# Altium footprint library MOLEX SMD.PcbLib: 54 footprints (part 3 of 4)
Each footprint in its own frame and in the unit in brackets; x right, y up, seen from the top. Pads: shape width x height; smd on the part's side, far side on the other; paste and mask are expansions set on the pad; w line width, h text height; cw(c..) or ccw(c..) is an arc to the next point about the centre after c.
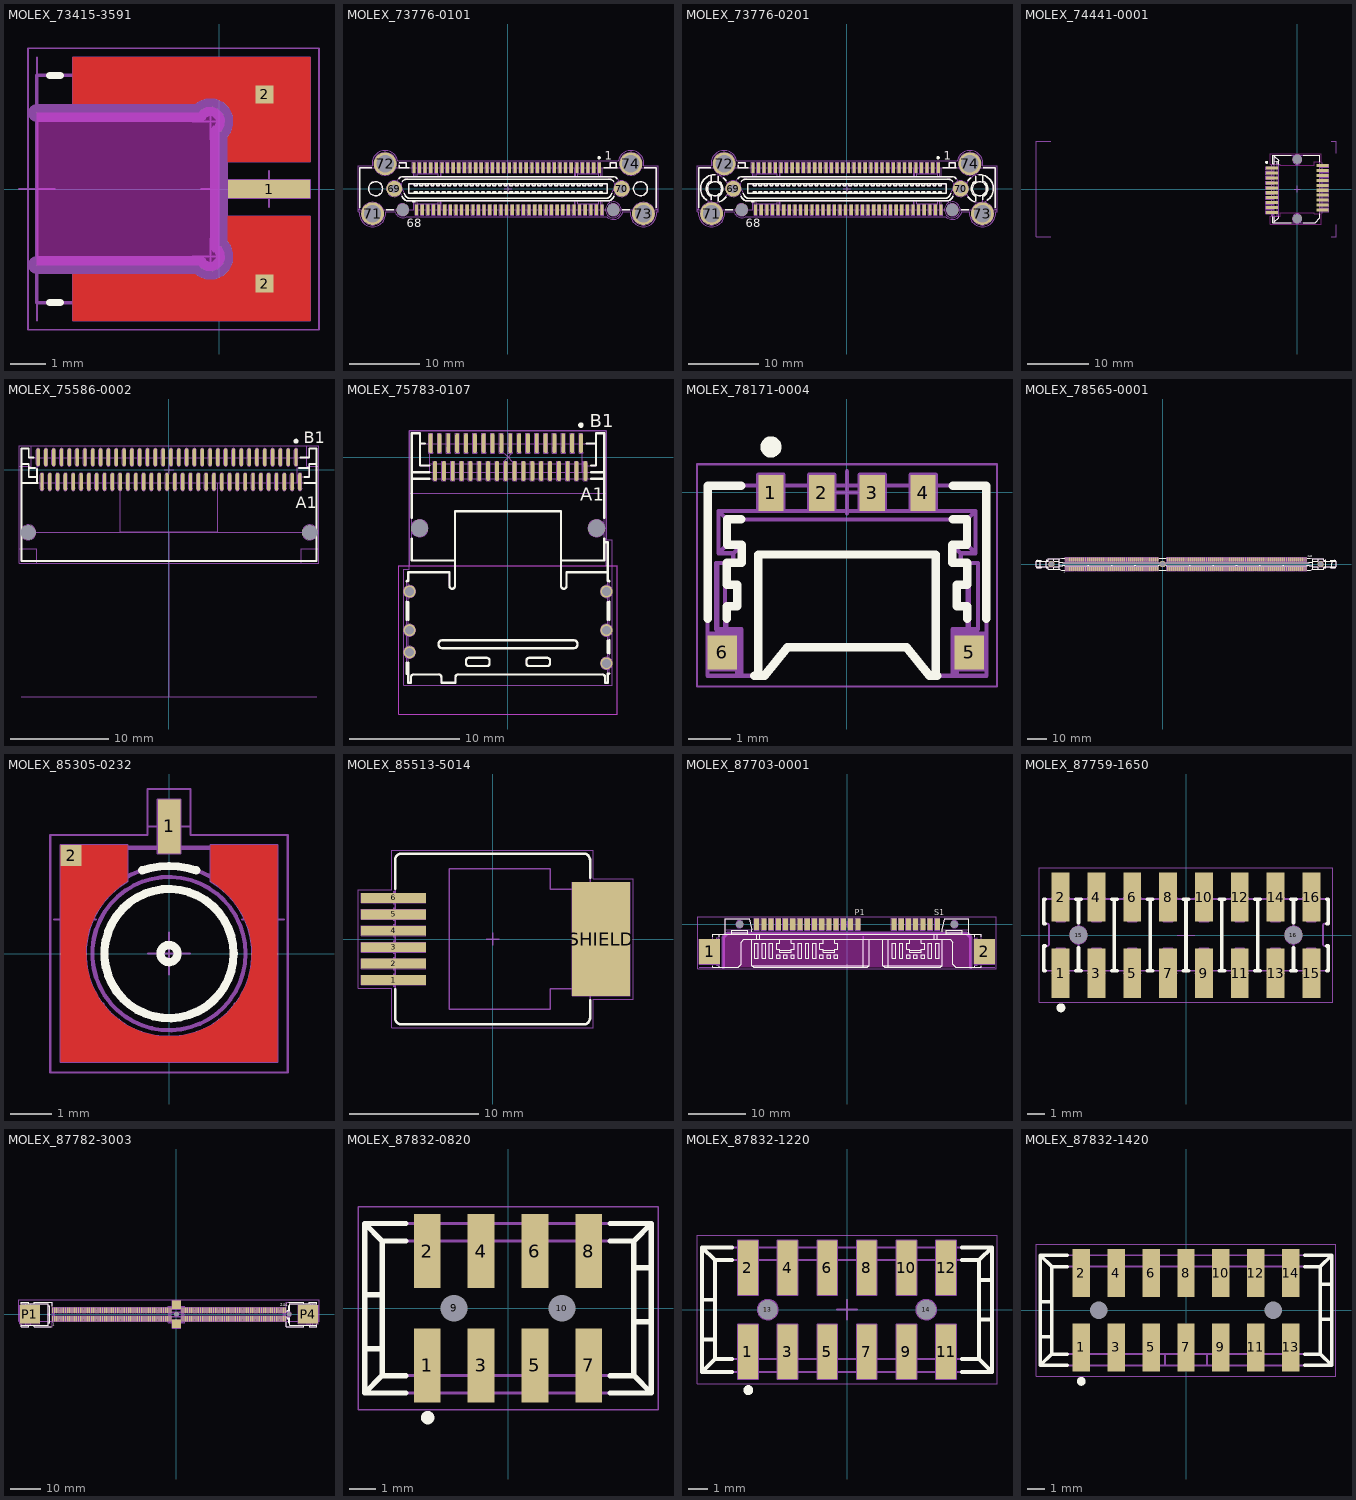
[diagram p2: the footprints below, top view; thin cyan lines are the x and y axes]

## MOLEX_73415-3591 [mm] "50 Ohms, SMP Edge Mount PCB Plug, Leg Length 1.27mm"
height 4.34
pads (3):
  rect 2.29x0.51 smd: 1(1.395,0)
  rect 0.5x0.5 smd paste-0.25 mask-0.25: 2(1.27,-2.637) 2(1.27,2.637)
Top Layer:
  region: -4.08,-3.675 -4.08,-2.375 -0.667,-2.375 -0.568,-2.446 -0.339,-2.527 -0.097,-2.519 0.126,-2.422 0.297,-2.251 0.394,-2.028 0.402,-1.786 0.321,-1.557 0.25,-1.458 0.25,-0.76 2.54,-0.76 2.54,-3.675
  region: -4.08,2.375 -4.08,3.675 2.54,3.675 2.54,0.76 0.25,0.76 0.25,1.458 0.321,1.557 0.402,1.786 0.394,2.028 0.297,2.251 0.126,2.422 -0.097,2.519 -0.339,2.527 -0.568,2.446 -0.667,2.375
Top Overlay:
  lines w0.2: -4.73,-3.169 -4.43,-3.169 ; -4.73,3.169 -4.43,3.169
Keep-Out Layer:
  board cut-out: -5.08,-2.125 -5.08,2.125 -0.56,2.125 -0.508,2.195 -0.355,2.278 -0.182,2.29 -0.019,2.229 0.104,2.106 0.165,1.943 0.153,1.77 0.069,1.617 0,1.565 0,-1.565 0.069,-1.617 0.153,-1.77 0.165,-1.943 0.104,-2.106 -0.019,-2.229 -0.182,-2.29 -0.355,-2.278 -0.508,-2.195 -0.56,-2.125
Mechanical 1:
  lines w0.5: -5.08,-2.125 -0.56,-2.125 ccw(c-0.24,-1.885) 0,-1.565 0,1.565 ccw(c-0.24,1.885) -0.56,2.125 -5.08,2.125
Mechanical 8:
  lines w0.05: -5.58,0 -5.08,0 ; -5.08,-3.675 -5.08,-2.375 ; -5.08,-0.5 -5.08,0 ; -5.08,0.5 -5.08,0 ; -5.08,2.375 -5.08,3.675 ; -4.58,0 -5.08,0 ; -0.74,-1.885 -0.24,-1.885 ; -0.74,1.885 -0.24,1.885 ; -0.5,0 0,0 ; -0.24,-2.385 -0.24,-1.885 ; -0.24,-1.385 -0.24,-1.885 ; -0.24,1.385 -0.24,1.885 ; -0.24,2.385 -0.24,1.885 ; 0,-0.5 0,0 ; 0,0.5 0,0 ; 0.26,-1.885 -0.24,-1.885 ; 0.26,1.885 -0.24,1.885 ; 0.5,0 0,0 ; 0.77,-2.637 1.27,-2.637 ; 0.77,2.637 1.27,2.637 ; 0.895,0 1.395,0 ; 1.27,-3.137 1.27,-2.637 ; 1.27,-2.137 1.27,-2.637 ; 1.27,2.137 1.27,2.637 ; 1.27,3.137 1.27,2.637 ; 1.395,-0.5 1.395,0 ; 1.395,0.5 1.395,0 ; 1.77,-2.637 1.27,-2.637 ; 1.77,2.637 1.27,2.637 ; 1.895,0 1.395,0 ; -4.08,-3.675 2.54,-3.675 2.54,-0.76 0.25,-0.76 0.25,-1.458 cw(c-0.24,-1.885) -0.667,-2.375 -4.08,-2.375 -4.08,-3.675 ; -4.08,2.375 -4.08,3.675 2.54,3.675 2.54,0.76 0.25,0.76 0.25,1.458 ccw(c-0.24,1.885) -0.667,2.375 -4.08,2.375 ; 0.25,-0.255 0.25,0.255 2.54,0.255 2.54,-0.255 0.25,-0.255
  text "PCB Edge" at -5.715,-2.54 h0.75
Mechanical 14:
  lines w0.1: -5.08,-2.22 0,-2.22 ; -5.08,2.22 0,2.22 ; 0,-2.105 1.27,-2.105 1.27,-3.169 0,-3.169 ; 0,-0.19 1.194,-0.19 1.27,-0.114 1.27,0.114 1.194,0.19 0,0.19 ; 0,2.105 1.27,2.105 1.27,3.169 0,3.169 ; 0,-3.169 0,3.169 ; 0,-3.169 -5.08,-3.169 -5.08,3.169 0,3.169
Mechanical 15:
  lines w0.05: -5.33,-3.925 -5.33,3.925 2.79,3.925 2.79,-3.925 -5.33,-3.925
Drill Drawing:
  text "5.08" at -3.175,-1.587 h0.75
  text "r0.4" at -2.381,0.794 h0.75
  text "4.25" at -3.969,-1.111 h0.75
3D body "MOLEX_73415-3591.stp": height 2.46, standoff -1.88, extent -5.08,-3.169 1.27,3.169

## MOLEX_73776-0101 [mm] "0.80mm Pitch, 68 Contacts, Ultra+ VHDCI Surface Mount Vertical Receptacle Without Screwlock Kit"
height 10.7
pads (76):
  rect 0.45x1.5 smd: 1(13,3) 2(12.2,3) 3(11.4,3) 4(10.6,3) 5(9.8,3) 6(9,3) 7(8.2,3) 8(7.4,3) 9(6.6,3) 10(5.8,3) 11(5,3) 12(4.2,3) 13(3.4,3) 14(2.6,3) 15(1.8,3) 16(1,3) 17(0.2,3) 18(-0.6,3) 19(-1.4,3) 20(-2.2,3) 21(-3,3) 22(-3.8,3) 23(-4.6,3) 24(-5.4,3) 25(-6.2,3) 26(-7,3) 27(-7.8,3) 28(-8.6,3) 29(-9.4,3) 30(-10.2,3) 31(-11,3) 32(-11.8,3) 33(-12.6,3) 34(-13.4,3) 35(13.4,-3) 36(12.6,-3) 37(11.8,-3) 38(11,-3) 39(10.2,-3) 40(9.4,-3) 41(8.6,-3) 42(7.8,-3) 43(7,-3) 44(6.2,-3) 45(5.4,-3) 46(4.6,-3) 47(3.8,-3) 48(3,-3) 49(2.2,-3) 50(1.4,-3) 51(0.6,-3) 52(-0.2,-3) 53(-1,-3) 54(-1.8,-3) 55(-2.6,-3) 56(-3.4,-3) 57(-4.2,-3) 58(-5,-3) 59(-5.8,-3) 60(-6.6,-3) 61(-7.4,-3) 62(-8.2,-3) 63(-9,-3) 64(-9.8,-3) 65(-10.6,-3) 66(-11.4,-3) 67(-12.2,-3) 68(-13,-3)
  round 2.25 hole 1.2: 69(-16.175,0) 70(16.175,0)
  round 3.24 hole 2.45: 71(-19.275,-3.55) 72(-17.485,3.55) 73(19.275,-3.55) 74(17.485,3.55)
  round 0.5 hole 1.75 unplated mask+0.625: 75(-14.995,-3) 75(14.995,-3)
Top Overlay:
  drawing of 242 lines, arcs and shapes, not listed
  text "1" at 13.8,4.1 h1.2
  text "68" at -14.4,-5.5 h1.2
Mechanical 8:
  drawing of 527 lines, arcs and shapes, not listed
Mechanical 14:
  drawing of 506 lines, arcs and shapes, not listed
  text "1" at 13.8,4.1 h1.2
  text "68" at -14.4,-5.5 h1.2
Mechanical 15:
  lines w0.05: -17.429,-3.25 cw(c-19.275,-3.55) -21.121,-3.25 -21.35,-3.25 -21.35,3.25 -19.331,3.25 cw(c-17.485,3.55) -15.67,4 15.67,4 cw(c17.485,3.55) 19.331,3.25 21.35,3.25 21.35,-3.25 21.121,-3.25 cw(c19.275,-3.55) 17.429,-3.25 16.347,-3.25 cw(c14.995,-3) 14.051,-4 -14.48,-4 cw(c-14.995,-3) -16.092,-3.25 ; -17.429,-3.25 -16.092,-3.25 ; -17.429,-3.25 -16.092,-3.25
3D body "MOLEX_73776-0101.stp": height 10.7, standoff -6.2, extent -21.25,-3.73 21.25,3.73

## MOLEX_73776-0201 [mm] "0.80mm Pitch, 68 Contacts, Ultra+ VHDCI Surface Mount Vertical Receptacle With Screwlock Kit"
height 10.7
pads (76):
  rect 0.45x1.5 smd: 1(13,3) 2(12.2,3) 3(11.4,3) 4(10.6,3) 5(9.8,3) 6(9,3) 7(8.2,3) 8(7.4,3) 9(6.6,3) 10(5.8,3) 11(5,3) 12(4.2,3) 13(3.4,3) 14(2.6,3) 15(1.8,3) 16(1,3) 17(0.2,3) 18(-0.6,3) 19(-1.4,3) 20(-2.2,3) 21(-3,3) 22(-3.8,3) 23(-4.6,3) 24(-5.4,3) 25(-6.2,3) 26(-7,3) 27(-7.8,3) 28(-8.6,3) 29(-9.4,3) 30(-10.2,3) 31(-11,3) 32(-11.8,3) 33(-12.6,3) 34(-13.4,3) 35(13.4,-3) 36(12.6,-3) 37(11.8,-3) 38(11,-3) 39(10.2,-3) 40(9.4,-3) 41(8.6,-3) 42(7.8,-3) 43(7,-3) 44(6.2,-3) 45(5.4,-3) 46(4.6,-3) 47(3.8,-3) 48(3,-3) 49(2.2,-3) 50(1.4,-3) 51(0.6,-3) 52(-0.2,-3) 53(-1,-3) 54(-1.8,-3) 55(-2.6,-3) 56(-3.4,-3) 57(-4.2,-3) 58(-5,-3) 59(-5.8,-3) 60(-6.6,-3) 61(-7.4,-3) 62(-8.2,-3) 63(-9,-3) 64(-9.8,-3) 65(-10.6,-3) 66(-11.4,-3) 67(-12.2,-3) 68(-13,-3)
  round 2.25 hole 1.2: 69(-16.175,0) 70(16.175,0)
  round 3.24 hole 2.45: 71(-19.275,-3.55) 72(-17.485,3.55) 73(19.275,-3.55) 74(17.485,3.55)
  round 0.5 hole 1.75 unplated mask+0.625: 75(-14.995,-3) 75(14.995,-3)
Top Overlay:
  drawing of 260 lines, arcs and shapes, not listed
  text "68" at -14.4,-5.5 h1.2
  text "1" at 13.8,4.1 h1.2
Mechanical 8:
  drawing of 527 lines, arcs and shapes, not listed
Mechanical 14:
  drawing of 520 lines, arcs and shapes, not listed
  text "68" at -14.4,-5.5 h1.2
  text "1" at 13.8,4.1 h1.2
Mechanical 15:
  lines w0.05: -17.429,-3.25 cw(c-19.275,-3.55) -21.121,-3.25 -21.35,-3.25 -21.35,3.25 -19.331,3.25 cw(c-17.485,3.55) -15.67,4 15.67,4 cw(c17.485,3.55) 19.331,3.25 21.35,3.25 21.35,-3.25 21.121,-3.25 cw(c19.275,-3.55) 17.429,-3.25 16.347,-3.25 cw(c14.995,-3) 14.051,-4 -14.48,-4 cw(c-14.995,-3) -16.092,-3.25 ; -17.429,-3.25 -16.092,-3.25 ; -17.429,-3.25 -16.092,-3.25
3D body "MOLEX_73776-0201.stp": height 10.7, standoff -6.2, extent -21.25,-3.73 21.25,3.73

## MOLEX_74441-0001 [mm] "20 Position, Pitch 0.8mm SFP+ Receptacle (Small Form-factor Pluggable)"
height 5.4
pads (22):
  rect 2x0.5 smd: 1(-4.1,3.395) 2(-4.1,2.595) 3(-4.1,1.795) 4(-4.1,0.995) 5(-4.1,0.195) 6(-4.1,-0.605) 7(-4.1,-1.405) 8(-4.1,-2.205) 9(-4.1,-3.005) 10(-4.1,-3.805) 11(4.1,-3.405) 12(4.1,-2.605) 13(4.1,-1.805) 14(4.1,-1.005) 15(4.1,-0.205) 16(4.1,0.595) 17(4.1,1.395) 18(4.1,2.195) 19(4.1,2.995) 20(4.1,3.795)
  round 0.5 hole 1.55 unplated mask+0.525: MTG1(0,4.795) MTG2(0,-4.805)
Top Layer keep-out:
  lines w0.1: -4.34,-5.755 3.94,-5.755 3.94,-4.805 3.94,-3.995 2.78,-3.995 2.78,-3.855 -2.78,-3.855 -2.78,-4.395 -4.34,-4.395 -4.34,-5.755 ; -4.34,3.985 -2.78,3.985 -2.78,3.845 2.78,3.845 2.78,4.385 3.94,4.385 3.94,5.745 -4.34,5.745 -4.34,3.985
Top Overlay:
  circle w0.25: c-4.955,4.318 r0.125
  lines w0.2: -4,-4.505 -4,-5.505 -0.944,-5.505 ; -3.7,-5.505 -3.7,-4.505 ; -3.7,-5.305 -2.98,-4.705 -2.98,-4.505 ; -3.7,4.045 -3.7,5.495 ; -3.7,4.095 -4,4.095 -4,5.495 -0.944,5.495 ; -3.7,4.432 -2.98,4.495 ; -3.7,5.295 -2.98,4.695 -2.98,4.045 ; -3.223,4.045 -3.223,4.474 ; 0.944,-5.505 2.9,-5.505 3.7,-4.705 3.7,-4.055 ; 0.944,5.495 3.7,5.495 3.7,4.445
Mechanical 8:
  circle w0.1: c0,4.795 r0.775
  circle w0.1: c0,-4.805 r0.775
  lines w0.1: -40,-7.774 -42.4,-7.774 -42.4,7.774 -40,7.774 ; -4.6,-3.805 -4.1,-3.805 -3.6,-3.805 ; -4.6,-3.005 -4.1,-3.005 -3.6,-3.005 ; -4.6,-2.205 -4.1,-2.205 -3.6,-2.205 ; -4.6,-1.405 -4.1,-1.405 -3.6,-1.405 ; -4.6,-0.605 -4.1,-0.605 -3.6,-0.605 ; -4.6,0.195 -4.1,0.195 -3.6,0.195 ; -4.6,0.995 -4.1,0.995 -3.6,0.995 ; -4.6,1.795 -4.1,1.795 -3.6,1.795 ; -4.6,2.595 -4.1,2.595 -3.6,2.595 ; -4.6,3.395 -4.1,3.395 -3.6,3.395 ; -4.1,-4.305 -4.1,3.895 ; -0.5,-4.805 0,-4.805 ; -0.5,0 0,0 ; -0.5,4.795 0,4.795 ; 0,-5.305 0,-4.805 ; 0,-4.305 0,-4.805 ; 0,-0.5 0,0 ; 0,0.5 0,0 ; 0,4.295 0,4.795 ; 0,5.295 0,4.795 ; 0.5,-4.805 0,-4.805 ; 0.5,0 0,0 ; 0.5,4.795 0,4.795 ; 3.6,-3.405 4.1,-3.405 4.6,-3.405 ; 3.6,-2.605 4.1,-2.605 4.6,-2.605 ; 3.6,-1.805 4.1,-1.805 4.6,-1.805 ; 3.6,-1.005 4.1,-1.005 4.6,-1.005 ; 3.6,-0.205 4.1,-0.205 4.6,-0.205 ; 3.6,0.595 4.1,0.595 4.6,0.595 ; 3.6,1.395 4.1,1.395 4.6,1.395 ; 3.6,2.195 4.1,2.195 4.6,2.195 ; 3.6,2.995 4.1,2.995 4.6,2.995 ; 3.6,3.795 4.1,3.795 4.6,3.795 ; 4.1,-3.905 4.1,4.295 ; 5.5,-7.774 6.3,-7.774 6.3,-5.777 ; 5.5,7.774 6.3,7.774 6.3,5.777
Mechanical 14:
  circle w0.1: c-4.955,4.318 r0.125
  lines w0.1: -3.7,-5.505 -3.7,-4.105 ; -3.7,-5.305 -2.98,-4.705 -2.98,-4.505 ; -3.7,-4.442 -2.98,-4.505 ; -3.7,-4.055 -5.1,-4.055 -5.1,-3.555 -3.7,-3.555 ; -3.7,-3.255 -5.1,-3.255 -5.1,-2.755 -3.7,-2.755 ; -3.7,-2.455 -5.1,-2.455 -5.1,-1.955 -3.7,-1.955 ; -3.7,-1.655 -5.1,-1.655 -5.1,-1.155 -3.7,-1.155 ; -3.7,-0.855 -5.1,-0.855 -5.1,-0.355 -3.7,-0.355 ; -3.7,-0.055 -5.1,-0.055 -5.1,0.445 -3.7,0.445 ; -3.7,0.745 -5.1,0.745 -5.1,1.245 -3.7,1.245 ; -3.7,1.545 -5.1,1.545 -5.1,2.045 -3.7,2.045 ; -3.7,2.345 -5.1,2.345 -5.1,2.845 -3.7,2.845 ; -3.7,3.145 -5.1,3.145 -5.1,3.645 -3.7,3.645 ; -3.7,4.432 -2.98,4.495 ; -3.7,5.295 -2.985,4.695 -2.98,4.695 -2.98,4.495 ; -3.7,5.495 -3.7,4.095 ; -3.223,-4.484 -3.223,4.474 ; 3.7,-3.655 5.1,-3.655 5.1,-3.155 3.7,-3.155 ; 3.7,-2.855 5.1,-2.855 5.1,-2.355 3.7,-2.355 ; 3.7,-2.055 5.1,-2.055 5.1,-1.555 3.7,-1.555 ; 3.7,-1.255 5.1,-1.255 5.1,-0.755 3.7,-0.755 ; 3.7,-0.455 5.1,-0.455 5.1,0.045 3.7,0.045 ; 3.7,0.345 5.1,0.345 5.1,0.845 3.7,0.845 ; 3.7,1.145 5.1,1.145 5.1,1.645 3.7,1.645 ; 3.7,1.945 5.1,1.945 5.1,2.445 3.7,2.445 ; 3.7,2.745 5.1,2.745 5.1,3.245 3.7,3.245 ; 3.7,3.545 5.1,3.545 5.1,4.045 3.7,4.045 ; -3.7,-4.105 -4,-4.105 -4,-5.505 2.9,-5.505 3.7,-4.705 3.7,5.495 -4,5.495 -4,4.095 -3.7,4.095 ; -3.7,-4.105 -3.7,4.095 ; -2.98,-4.505 -2.98,4.495
3D body "MOLEX_74441-0001.stp": height 5.37, standoff -0.9, extent -4.54,-5.5 4.61,5.5

## MOLEX_75586-0002 [mm] "68 Circuits, Pitch 0.8mm, External Application Right Angle iPass™ I/O Surface Mount Receptacle"
height 5.43
pads (70):
  oval 0.35x1.8 smd: A1(13.4,-1.255) A2(12.6,-1.255) A3(11.8,-1.255) A4(11,-1.255) A5(10.2,-1.255) A6(9.4,-1.255) A7(8.6,-1.255) A8(7.8,-1.255) A9(7,-1.255) A10(6.2,-1.255) A11(5.4,-1.255) A12(4.6,-1.255) A13(3.8,-1.255) A14(3,-1.255) A15(2.2,-1.255) A16(1.4,-1.255) A17(0.6,-1.255) A18(-0.2,-1.255) A19(-1,-1.255) A20(-1.8,-1.255) A21(-2.6,-1.255) A22(-3.4,-1.255) A23(-4.2,-1.255) A24(-5,-1.255) A25(-5.8,-1.255) A26(-6.6,-1.255) A27(-7.4,-1.255) A28(-8.2,-1.255) A29(-9,-1.255) A30(-9.8,-1.255) A31(-10.6,-1.255) A32(-11.4,-1.255) A33(-12.2,-1.255) A34(-13,-1.255) B1(13,1.255) B2(12.2,1.255) B3(11.4,1.255) B4(10.6,1.255) B5(9.8,1.255) B6(9,1.255) B7(8.2,1.255) B8(7.4,1.255) B9(6.6,1.255) B10(5.8,1.255) B11(5,1.255) B12(4.2,1.255) B13(3.4,1.255) B14(2.6,1.255) B15(1.8,1.255) B16(1,1.255) B17(0.2,1.255) B18(-0.6,1.255) B19(-1.4,1.255) B20(-2.2,1.255) B21(-3,1.255) B22(-3.8,1.255) B23(-4.6,1.255) B24(-5.4,1.255) B25(-6.2,1.255) B26(-7,1.255) B27(-7.8,1.255) B28(-8.6,1.255) B29(-9.4,1.255) B30(-10.2,1.255) B31(-11,1.255) B32(-11.8,1.255) B33(-12.6,1.255) B34(-13.4,1.255)
  round 0.5 hole 1.55 unplated mask+0.525: MTG1(-14.4,-6.435) MTG2(14.4,-6.435)
Top Overlay:
  circle w0.25: c13,2.9 r0.125
  lines w0.2: -15.1,-1.367 -13.475,-1.367 ; -15.1,0.568 -14.35,0.568 -14.35,-0.759 -13.5,-0.759 ; -14.35,0.168 -13.708,0.168 ; -13.875,1.221 -14.35,1.221 -14.35,2.166 -15.1,2.166 -15.1,-9.338 15.1,-9.338 15.1,2.166 14.35,2.166 14.35,1.221 13.475,1.221 ; -13.5,-1.367 -13.5,0.066 ; 13.308,0.168 14.35,0.168 ; 13.875,-1.367 15.1,-1.367 ; 13.875,-0.759 14.35,-0.759 14.35,0.568 15.1,0.568
  text "A1" at 12.95,-3.95 h1.2
  text "B1" at 13.8,2.7 h1.2
Mechanical 8:
  drawing of 443 lines, arcs and shapes, not listed
  text "PCB Edge" at -4.675,-22.7 h1.2
Mechanical 14:
  lines w0.1: -15.1,-1.367 15.1,-1.367 ; -15.1,0.568 -14.35,0.568 -14.35,-0.759 -13.5,-0.759 ; -14.35,0.168 -13.5,0.168 ; -13.5,-1.367 -13.5,1.221 -13.5,1.78 -13.3,1.78 -13.3,1.221 ; -12.7,1.221 -12.7,1.78 -12.5,1.78 -12.5,1.221 ; -11.9,1.221 -11.9,1.78 -11.7,1.78 -11.7,1.221 ; -11.1,1.221 -11.1,1.78 -10.9,1.78 -10.9,1.221 ; -10.3,1.221 -10.3,1.78 -10.1,1.78 -10.1,1.221 ; -9.5,1.221 -9.5,1.78 -9.3,1.78 -9.3,1.221 ; -8.7,1.221 -8.7,1.78 -8.5,1.78 -8.5,1.221 ; -7.9,1.221 -7.9,1.78 -7.7,1.78 -7.7,1.221 ; -7.1,1.221 -7.1,1.78 -6.9,1.78 -6.9,1.221 ; -6.3,1.221 -6.3,1.78 -6.1,1.78 -6.1,1.221 ; -5.5,1.221 -5.5,1.78 -5.3,1.78 -5.3,1.221 ; -4.7,1.221 -4.7,1.78 -4.5,1.78 -4.5,1.221 ; -3.9,1.221 -3.9,1.78 -3.7,1.78 -3.7,1.221 ; -3.1,1.221 -3.1,1.78 -2.9,1.78 -2.9,1.221 ; -2.3,1.221 -2.3,1.78 -2.1,1.78 -2.1,1.221 ; -1.5,1.221 -1.5,1.78 -1.3,1.78 -1.3,1.221 ; -0.7,1.221 -0.7,1.78 -0.5,1.78 -0.5,1.221 ; 0.1,1.221 0.1,1.78 0.3,1.78 0.3,1.221 ; 0.9,1.221 0.9,1.78 1.1,1.78 1.1,1.221 ; 1.7,1.221 1.7,1.78 1.9,1.78 1.9,1.221 ; 2.5,1.221 2.5,1.78 2.7,1.78 2.7,1.221 ; 3.3,1.221 3.3,1.78 3.5,1.78 3.5,1.221 ; 4.1,1.221 4.1,1.78 4.3,1.78 4.3,1.221 ; 4.9,1.221 4.9,1.78 5.1,1.78 5.1,1.221 ; 5.7,1.221 5.7,1.78 5.9,1.78 5.9,1.221 ; 6.5,1.221 6.5,1.78 6.7,1.78 6.7,1.221 ; 7.3,1.221 7.3,1.78 7.5,1.78 7.5,1.221 ; 8.1,1.221 8.1,1.78 8.3,1.78 8.3,1.221 ; 8.9,1.221 8.9,1.78 9.1,1.78 9.1,1.221 ; 9.7,1.221 9.7,1.78 9.9,1.78 9.9,1.221 ; 10.5,1.221 10.5,1.78 10.7,1.78 10.7,1.221 ; 11.3,1.221 11.3,1.78 11.5,1.78 11.5,1.221 ; 12.1,1.221 12.1,1.78 12.3,1.78 12.3,1.221 ; 12.9,1.221 12.9,1.78 13.1,1.78 13.1,1.221 ; 13.1,-1.367 13.1,0.168 14.35,0.168 ; 13.1,-0.759 14.35,-0.759 14.35,0.568 15.1,0.568 ; -15.1,-9.338 -15.1,2.166 -14.35,2.166 -14.35,1.221 14.35,1.221 14.35,2.166 15.1,2.166 15.1,-9.338 -15.1,-9.338 ; -5,-6.367 5,-6.367 5,-1.367 -5,-1.367 -5,-6.367
  text "A1" at 12.95,-3.95 h1.2
  text "B1" at 13.8,2.7 h1.2
Mechanical 15:
  lines w0.1: -15.35,-9.588 -15.35,2.416 15.35,2.416 15.35,-9.588 -15.35,-9.588
3D body "MOLEX_75586-0002.stp": height 5.38, standoff -0.95, extent -15.1,-9.338 15.1,2.166

## MOLEX_75783-0107 [mm] "36 Circuit, Right Angle , Internal Assembly, iPass™ I/O Surface Mount Receptacle with Left Key Shell"
height 8.47
pads (44):
  oval 0.35x1.8 smd: A1(7,-1.255) A2(6.2,-1.255) A3(5.4,-1.255) A4(4.6,-1.255) A5(3.8,-1.255) A6(3,-1.255) A7(2.2,-1.255) A8(1.4,-1.255) A9(0.6,-1.255) A10(-0.2,-1.255) A11(-1,-1.255) A12(-1.8,-1.255) A13(-2.6,-1.255) A14(-3.4,-1.255) A15(-4.2,-1.255) A16(-5,-1.255) A17(-5.8,-1.255) A18(-6.6,-1.255) B1(6.6,1.255) B2(5.8,1.255) B3(5,1.255) B4(4.2,1.255) B5(3.4,1.255) B6(2.6,1.255) B7(1.8,1.255) B8(1,1.255) B9(0.2,1.255) B10(-0.6,1.255) B11(-1.4,1.255) B12(-2.2,1.255) B13(-3,1.255) B14(-3.8,1.255) B15(-4.6,1.255) B16(-5.4,1.255) B17(-6.2,1.255) B18(-7,1.255)
  round 0.5 hole 1.55 unplated mask+0.525: MTG1(-8,-6.435) MTG2(8,-6.435)
  round 1.1 hole 0.8: SHELL1(-8.9,-12.155) SHELL2(-8.9,-15.655) SHELL3(-8.9,-17.655) SHELL4(8.9,-12.155) SHELL5(8.9,-15.655) SHELL6(8.9,-18.655)
Top Layer keep-out:
  lines w0.1: -9.9,-23.235 -9.9,-9.835 9.9,-9.835 9.9,-23.235 -9.9,-23.235
Top Overlay:
  circle w0.25: c6.6,2.9 r0.125
  lines w0.2: -9.175,-18.564 -9.175,-19.515 ccw(c-9.055,-19.515) -9.055,-19.635 -9.025,-19.635 ; -9.162,-11.242 cw(c-9.055,-11.295) -9.055,-11.175 -9.025,-11.175 ; -9.025,-18.597 -9.025,-20.405 -8.769,-20.405 -8.775,-19.908 cw(c-8.525,-19.905) -8.525,-19.655 -6.275,-19.655 cw(c-6.275,-19.905) -6.025,-19.905 -6.025,-20.405 -4.75,-20.405 -4.75,-19.905 cw(c-4.5,-19.905) -4.5,-19.655 8.525,-19.655 cw(c8.525,-19.905) 8.775,-19.905 8.775,-20.405 9.025,-20.405 9.025,-19.597 ; -9.025,-11.213 -9.025,-10.405 -5.3,-10.405 -5.3,-11.655 ccw(c-5.05,-11.655) -4.8,-11.655 -4.8,-4.893 4.8,-4.893 4.8,-11.655 ccw(c5.05,-11.655) 5.3,-11.655 5.3,-10.405 9.025,-10.405 ; -8.7,-7.379 -8.7,-9.338 -4.8,-9.338 ; -8.7,-5.491 -8.7,2.166 -7.95,2.166 -7.95,-0.759 -7.125,-0.759 ; -8.7,-1.954 -7.125,-1.954 ; -8.7,-1.367 -7.125,-1.367 ; -7.95,1.221 -7.525,1.221 ; 4.8,-9.338 8.7,-9.338 8.7,-7.379 ; 7.125,1.221 7.95,1.221 ; 7.525,-1.954 8.7,-1.954 ; 7.525,-1.367 8.7,-1.367 ; 7.525,-0.759 7.95,-0.759 7.95,2.166 8.7,2.166 8.7,-5.491 ; 8.7,-7.707 9.025,-7.707 9.025,-11.213 ; 9.025,-19.635 9.055,-19.635 ccw(c9.055,-19.515) 9.163,-19.568 ; 9.025,-17.713 9.025,-16.597 ; 9.025,-14.713 9.025,-13.097 ; 9.025,-11.175 9.055,-11.175 cw(c9.055,-11.295) 9.163,-11.242 ; 9.175,-17.746 9.175,-16.564 ; 9.175,-14.746 9.175,-13.064 ; -9.175,-14.746 -9.175,-13.064 -9.175,-14.746 ; -9.025,-14.713 -9.025,-13.097 -9.025,-14.713 ; -6.275,-16.98 ccw(c-5.975,-16.98) -5.975,-17.28 5.975,-17.28 ccw(c5.975,-16.98) 6.275,-16.98 6.275,-16.87 ccw(c5.975,-16.87) 5.975,-16.57 -5.975,-16.57 ccw(c-5.975,-16.87) -6.275,-16.87 -6.275,-16.98 ; -3.8,-18.655 ccw(c-3.55,-18.655) -3.55,-18.905 -1.92,-18.905 ccw(c-1.92,-18.655) -1.67,-18.655 -1.67,-18.405 ccw(c-1.92,-18.405) -1.92,-18.155 -3.55,-18.155 ccw(c-3.55,-18.405) -3.8,-18.405 -3.8,-18.655 ; 1.67,-18.655 ccw(c1.92,-18.655) 1.92,-18.905 3.55,-18.905 ccw(c3.55,-18.655) 3.8,-18.655 3.8,-18.405 ccw(c3.55,-18.405) 3.55,-18.155 1.92,-18.155 ccw(c1.92,-18.405) 1.67,-18.405 1.67,-18.655
  text "B1" at 7.4,2.7 h1.2
  text "A1" at 6.55,-3.95 h1.2
Mechanical 8:
  drawing of 275 lines, arcs and shapes, not listed
  text "PCB Edge" at -4.025,-22.7 h1.2
Mechanical 14:
  lines w0.1: -9.025,-19.635 -9.055,-19.635 cw(c-9.055,-19.515) -9.175,-19.515 -9.175,-11.295 cw(c-9.055,-11.295) -9.055,-11.175 -9.025,-11.175 ; -8.7,-1.954 8.7,-1.954 ; -8.7,-1.367 8.7,-1.367 ; -7.95,1.221 7.95,1.221 ; -7.1,-1.367 -7.1,1.221 ; -7.1,-0.759 -7.95,-0.759 -7.95,2.166 -8.7,2.166 -8.7,-9.338 -4.8,-9.338 ; -7.1,-0.608 6.7,-0.608 ; 4.8,-9.338 8.7,-9.338 8.7,2.166 7.95,2.166 7.95,-0.759 6.7,-0.759 ; 6.7,-1.367 6.7,1.221 ; 8.7,-7.707 9.025,-7.707 9.025,-20.405 8.775,-20.405 8.775,-19.905 ccw(c8.525,-19.905) 8.525,-19.655 -4.5,-19.655 ccw(c-4.5,-19.905) -4.75,-19.905 -4.75,-20.405 -6.025,-20.405 -6.025,-19.905 ccw(c-6.275,-19.905) -6.275,-19.655 -8.525,-19.655 ccw(c-8.525,-19.905) -8.775,-19.908 -8.769,-20.405 -9.025,-20.405 -9.025,-10.405 -5.3,-10.405 -5.3,-11.655 ccw(c-5.05,-11.655) -4.8,-11.655 -4.8,-4.893 4.8,-4.893 4.8,-11.655 ccw(c5.05,-11.655) 5.3,-11.655 5.3,-10.405 9.025,-10.405 ; 9.025,-19.635 9.055,-19.635 ccw(c9.055,-19.515) 9.175,-19.515 9.175,-11.295 ccw(c9.055,-11.295) 9.055,-11.175 9.025,-11.175 ; -6.275,-16.98 ccw(c-5.975,-16.98) -5.975,-17.28 5.975,-17.28 ccw(c5.975,-16.98) 6.275,-16.98 6.275,-16.87 ccw(c5.975,-16.87) 5.975,-16.57 -5.975,-16.57 ccw(c-5.975,-16.87) -6.275,-16.87 -6.275,-16.98 ; -3.8,-18.655 ccw(c-3.55,-18.655) -3.55,-18.905 -1.92,-18.905 ccw(c-1.92,-18.655) -1.67,-18.655 -1.67,-18.405 ccw(c-1.92,-18.405) -1.92,-18.155 -3.55,-18.155 ccw(c-3.55,-18.405) -3.8,-18.405 -3.8,-18.655 ; 1.67,-18.655 ccw(c1.92,-18.655) 1.92,-18.905 3.55,-18.905 ccw(c3.55,-18.655) 3.8,-18.655 3.8,-18.405 ccw(c3.55,-18.405) 3.55,-18.155 1.92,-18.155 ccw(c1.92,-18.405) 1.67,-18.405 1.67,-18.655
  text "B1" at 7.4,2.7 h1.2
  text "A1" at 6.55,-3.95 h1.2
Mechanical 15:
  lines w0.05: -9.425,-20.655 -9.425,-10.155 -8.95,-10.155 -8.95,2.405 8.95,2.405 8.95,-7.457 9.425,-7.457 9.425,-20.655 -9.425,-20.655
3D body "MOLEX_75783-0107.stp": height 8.62, standoff -1.96, extent -9.175,-20.405 9.175,2.166

## MOLEX_78171-0004 [mm] "1.20mm Pitch Pico-EZmate Wire-to-Board Header, Vertical, Housing Height: 1.55mm, with Side-Friction Locks, 4 Circuits"
height 1.55
pads (6):
  rect 0.6x0.85 smd: 1(-1.8,-0.01) 2(-0.6,-0.01) 3(0.6,-0.01) 4(1.8,-0.01)
  rect 0.7x0.8 smd: 5(2.89,-3.788) 6(-2.95,-3.788)
Top Overlay:
  circle w0.25: c-1.8,1.075 r0.125
  lines w0.2: -3.3,-2.99 -3.3,0.16 -2.5,0.16 ; -2.85,-2.99 -2.85,-2.69 -2.6,-2.69 -2.6,-2.19 -2.85,-2.19 -2.85,-1.67 -2.49,-1.67 -2.49,-1.24 -2.84,-1.24 -2.84,-0.64 -2.5,-0.64 ; -2.2,-4.34 -1.95,-4.34 -1.41,-3.66 1.41,-3.66 1.95,-4.34 2.14,-4.34 ; -2.1,-4.34 -2.1,-1.47 2.1,-1.47 2.1,-4.34 ; 2.5,-0.64 2.84,-0.64 2.84,-1.24 2.49,-1.24 2.49,-1.67 2.85,-1.67 2.85,-2.19 2.6,-2.19 2.6,-2.69 2.85,-2.69 2.85,-2.99 ; 2.5,0.16 3.3,0.16 3.3,-2.99
Mechanical 7:
  lines w0.1: -2.85,-1.67 -2.49,-1.67
Mechanical 8:
  lines w0.1: -0.5,0 0,0 ; 0,-0.5 0,0 ; 0,0.5 0,0 ; 0.5,0 0,0 ; -3.3,-4.185 -2.95,-3.788 -2.6,-4.185 ; -3.3,-4.185 -3.3,-3.39 -2.6,-3.39 -2.6,-4.185 ; -3.3,-4.185 -2.6,-4.185 ; -2.1,-0.435 -1.5,-0.435 ; -2.1,-0.435 -2.1,0.415 -1.5,0.415 -1.5,-0.435 ; -2.1,-0.435 -1.8,-0.01 -1.5,-0.435 ; -0.9,-0.435 -0.3,-0.435 ; -0.9,-0.435 -0.9,0.415 -0.3,0.415 -0.3,-0.435 ; -0.9,-0.435 -0.6,-0.01 -0.3,-0.435 ; 0.3,-0.435 0.9,-0.435 ; 0.3,-0.435 0.3,0.415 0.9,0.415 0.9,-0.435 ; 0.3,-0.435 0.6,-0.01 0.9,-0.435 ; 1.5,-0.435 2.1,-0.435 ; 1.5,-0.435 1.5,0.415 2.1,0.415 2.1,-0.435 ; 1.5,-0.435 1.8,-0.01 2.1,-0.435 ; 2.54,-4.185 2.89,-3.788 3.24,-4.185 ; 2.54,-4.185 2.54,-3.39 3.24,-3.39 3.24,-4.185 ; 2.54,-4.185 3.24,-4.185
Mechanical 14:
  lines w0.1: -3.3,-3.44 -2.6,-3.44 ; -3.3,-3.34 -2.5,-3.34 -2.6,-3.44 ; -3.07,-3.24 -3.07,-1.67 ; -2.89,-3.24 -2.89,-1.67 ; -2.85,-3.24 -2.85,-2.69 -2.6,-2.69 -2.6,-2.19 -2.85,-2.19 -2.85,-1.67 ; -2.69,-1.67 -2.69,-1.44 ; -2.6,-4.34 -2.6,-3.44 ; -2.5,-4.34 -2.5,-3.24 -3.1,-3.24 -3.1,-1.67 -2.49,-1.67 -2.49,-1.24 ; -2.1,-4.34 -2.1,-1.47 2.1,-1.47 2.1,-4.34 ; 2.5,-4.34 2.5,-3.24 3.1,-3.24 3.1,-1.67 2.49,-1.67 2.49,-1.24 ; 2.6,-4.34 2.6,-3.44 ; 2.69,-1.67 2.69,-1.44 ; 2.85,-3.24 2.85,-1.67 ; 2.85,-2.69 2.6,-2.69 2.6,-2.19 2.85,-2.19 ; 2.89,-3.24 2.89,-1.67 ; 3.3,-3.44 2.6,-3.44 ; 3.3,-3.34 2.5,-3.34 2.6,-3.44 ; -3.04,-1.44 -2.69,-1.44 ; -3.04,-1.44 -2.84,-1.24 ; -3.04,-1.44 -3.04,-0.44 ; -3.04,-0.44 3.04,-0.44 ; -3.04,-0.44 -2.84,-0.64 ; -2.84,-1.24 -2.84,-0.64 ; -2.84,-1.24 -2.49,-1.24 ; -2.84,-0.64 2.84,-0.64 ; -2.69,-1.44 -2.49,-1.24 ; 2.49,-1.24 2.84,-1.24 ; 2.49,-1.24 2.69,-1.44 ; 2.69,-1.44 3.04,-1.44 ; 2.84,-1.24 2.84,-0.64 ; 2.84,-1.24 3.04,-1.44 ; 2.84,-0.64 3.04,-0.44 ; 3.04,-1.44 3.04,-0.44 ; -3.3,-4.34 -1.95,-4.34 -1.41,-3.66 1.41,-3.66 1.95,-4.34 3.3,-4.34 3.3,0.16 -3.3,0.16 -3.3,-4.34 ; -3.02,-4.17 -3.02,-3.5 -2.82,-3.5 -2.82,-4.17 -3.02,-4.17 ; 2.82,-4.17 3.02,-4.17 3.02,-3.5 2.82,-3.5 2.82,-4.17